# Altium footprint library Components.PcbLib: 41 footprints (part 3 of 3)
Each footprint in its own frame and in the unit in brackets; x right, y up, seen from the top. Pads: shape width x height; smd on the part's side, far side on the other; paste and mask are expansions set on the pad; w line width, h text height; cw(c..) or ccw(c..) is an arc to the next point about the centre after c.
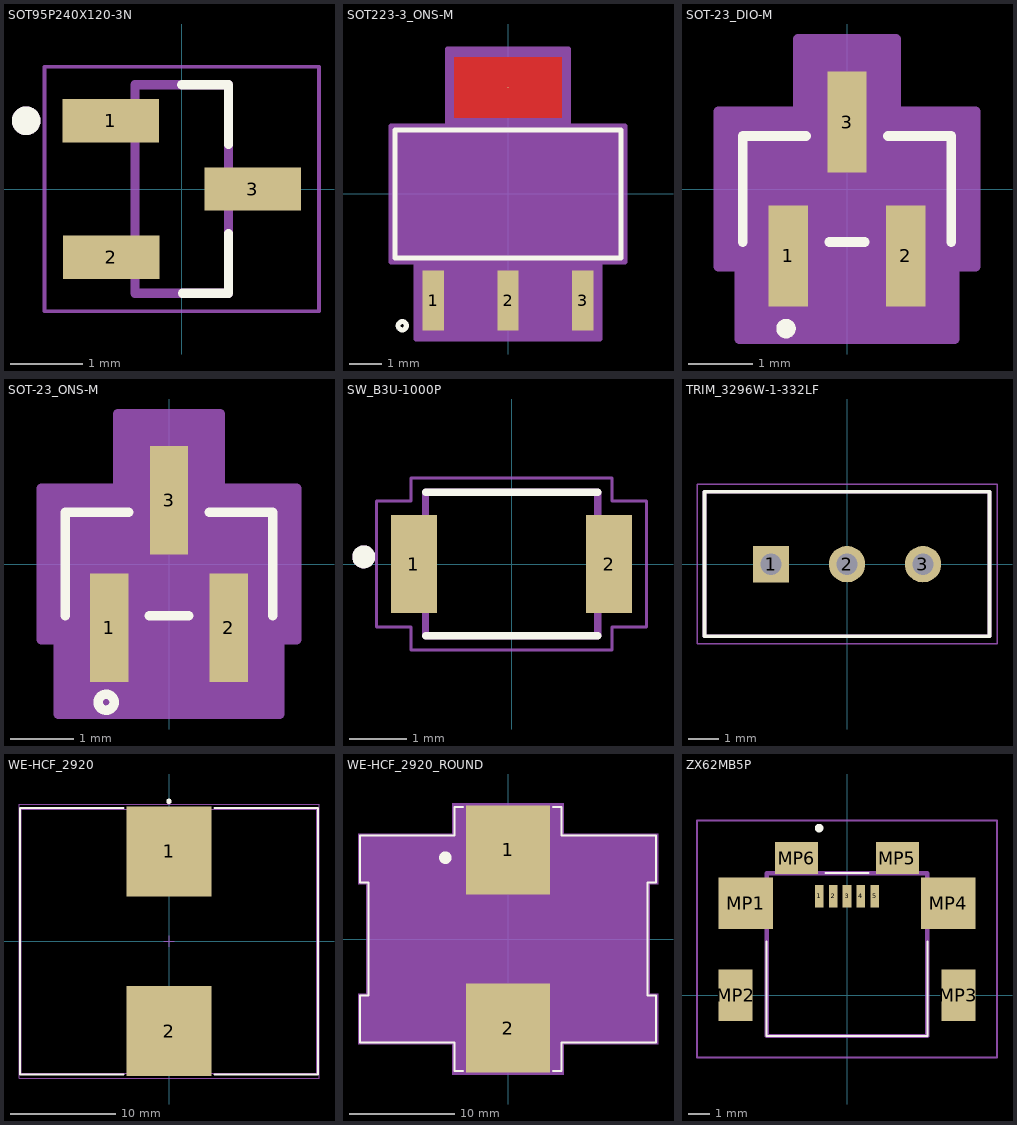
[diagram p2: the footprints below, top view; thin cyan lines are the x and y axes]

## SOT95P240X120-3N [mm]
height 1.2
pads (3):
  rect 1.34x0.6 smd paste+0 mask+0.102: 1(-0.99,0.95) 2(-0.98,-0.95) 3(0.99,0)
Top Overlay:
  circle w0.2: c-2.165,0.95 r0.1
  lines w0.127: 0,1.45 0.65,1.45 0.65,0.62 ; 0.01,-1.45 0.65,-1.45 0.65,-0.62
Mechanical 13:
  circle w0.2: c-2.165,0.95 r0.1
  lines w0.127: -0.65,-1.45 0.65,-1.45 0.65,1.45 -0.65,1.45 -0.65,-1.45
Mechanical 15:
  lines w0.05: -1.91,-1.7 1.91,-1.7 1.91,1.7 -1.91,1.7 -1.91,-1.7

## SOT223-3_ONS-M [mil]
pads (4):
  rect 26x73 smd paste+0 mask+0: 1(-90.5,-129) 2(0,-129) 3(90.5,-129)
  round 1 smd: 4(0,129)
Top Layer:
  region: 65,92.5 65,165.5 -65,165.5 -65,92.5
Top Overlay:
  circle w6: c-127.95,-159.45 r5
  lines w6: -136.5,-77.5 -136.5,77.5 136.5,77.5 136.5,-77.5 -136.5,-77.5
Top Paste:
  region: 65,92.5 65,165.5 -65,165.5 -65,92.5
Top Solder:
  region: 67,74.5 67,187.5 -67,187.5 -67,74.5
Mechanical 13:
  circle w0: c-121.5,-62.5 r5
  lines w1: -131.5,-72.5 -131.5,72.5 131.5,72.5 131.5,-72.5 -131.5,-72.5 ; -101.5,-143.5 -79.5,-143.5 -79.5,-72.5 -101.5,-72.5 -101.5,-143.5 ; -63,72.5 -63,143.5 63,143.5 63,72.5 -63,72.5 ; -11,-143.5 11,-143.5 11,-72.5 -11,-72.5 -11,-143.5 ; 79.5,-143.5 101.5,-143.5 101.5,-72.5 79.5,-72.5 79.5,-143.5
Mechanical 15:
  region: -141.5,-82.5 -141.5,82.5 -73,82.5 -73,175.5 73,175.5 73,82.5 141.5,82.5 141.5,-82.5 111.5,-82.5 111.5,-175.5 -111.5,-175.5 -111.5,-82.5
  lines w6: -141.5,-82.5 -111.5,-82.5 -111.5,-175.5 111.5,-175.5 111.5,-82.5 141.5,-82.5 141.5,82.5 73,82.5 73,175.5 -73,175.5 -73,82.5 -141.5,82.5 -141.5,-82.5
3D body "SOT223-3_ONS.step": height 68.11, standoff 0, extent -131.5,-143.5 131.5,143.5

## SOT-23_DIO-M [mil]
pads (3):
  rect 24x62 smd paste+0 mask+0: 1(-36.02,-41) 2(36.02,-41) 3(0,41)
Top Overlay:
  circle w6: c-37.4,-85.63 r3
  lines w6: -64,-32.5 -64,32.5 -25.1,32.5 ; -10.92,-32.5 10.92,-32.5 ; 25.1,32.5 64,32.5 64,-32.5
Mechanical 13:
  circle w0: c-36.02,-17.5 r3
  lines w1: -59,-27.5 -59,27.5 59,27.5 59,-27.5 -59,-27.5 ; -46.02,-50 -26.02,-50 -26.02,-27.5 -46.02,-27.5 -46.02,-50 ; -10,27.5 -10,50 10,50 10,27.5 -10,27.5 ; 26.02,-50 46.02,-50 46.02,-27.5 26.02,-27.5 26.02,-50
Mechanical 15:
  region: -79,-47.5 -79,47.5 -30,47.5 -30,92 30,92 30,47.5 79,47.5 79,-47.5 66.02,-47.5 66.02,-92 -66.02,-92 -66.02,-47.5
  lines w6: -79,-47.5 -66.02,-47.5 -66.02,-92 66.02,-92 66.02,-47.5 79,-47.5 79,47.5 30,47.5 30,92 -30,92 -30,47.5 -79,47.5 -79,-47.5
3D body "SOT-23_DIO.step": height 45.12, standoff 0, extent -59.02,-50 59.02,50

## SOT-23_ONS-M [mil]
pads (3):
  rect 24x68 smd paste+0 mask+0: 1(-37.5,-40) 2(37.5,-40) 3(0,40)
Top Overlay:
  circle w6: c-39.37,-86.61 r5
  lines w6: -65,-32.5 -65,32.5 -25.1,32.5 ; -12.4,-32.5 12.4,-32.5 ; 25.1,32.5 65,32.5 65,-32.5
Mechanical 13:
  circle w0: c-50,-17.5 r5
  lines w1: -60,-27.5 60,-27.5 60,27.5 -60,27.5 -60,-27.5 ; -47.5,-52 -47.5,-27.5 -27.5,-27.5 -27.5,-52 -47.5,-52 ; -10,27.5 10,27.5 10,52 -10,52 -10,27.5 ; 27.5,-52 27.5,-27.5 47.5,-27.5 47.5,-52 27.5,-52
Mechanical 15:
  region: -80,-47.5 -80,47.5 -32,47.5 -32,94 32,94 32,47.5 80,47.5 80,-47.5 69.5,-47.5 69.5,-94 -69.5,-94 -69.5,-47.5
  region: 60,-27.5 -60,-27.5 -60,27.5 60,27.5
  lines w6: -80,-47.5 -80,47.5 -32,47.5 -32,94 32,94 32,47.5 80,47.5 80,-47.5 69.5,-47.5 69.5,-94 -69.5,-94 -69.5,-47.5 -80,-47.5
3D body "SOT-23_ONS.step": height 44.09, standoff 0, extent -60,-52.01 60,52.01

## SW_B3U-1000P [mm]
pads (2):
  rect 0.8x1.7 smd: 1(-1.7,0) 2(1.7,0)
Top Overlay:
  circle w0.2: c-2.575,0.125 r0.1
  lines w0.127: -1.5,-1.25 1.5,-1.25 ; -1.5,1.25 1.5,1.25
Mechanical 13:
  circle w0.2: c-2.575,0.125 r0.1
  lines w0.127: -1.5,-1.25 1.5,-1.25 1.5,1.25 -1.5,1.25 -1.5,-1.25
Mechanical 15:
  lines w0.05: -2.35,-1.1 -2.35,1.1 -1.75,1.1 -1.75,1.5 1.75,1.5 1.75,1.1 2.35,1.1 2.35,-1.1 1.75,-1.1 1.75,-1.5 -1.75,-1.5 -1.75,-1.1 -2.35,-1.1
3D body "B3U-1000P.STEP": height 1.75, standoff 0, extent -2.025,-1.25 1.975,1.25

## TRIM_3296W-1-332LF [mm]
pads (3):
  rect 1.218x1.218 / inner round 1.218 / far side rect 1.218x1.218 hole 0.71: 1(-2.54,0)
  round 1.218 hole 0.71: 2(0,0) 3(2.54,0)
Top Overlay:
  lines w0.127: -4.765,-2.41 -4.765,2.42 4.765,2.42 4.765,-2.41 -4.765,-2.41
Mechanical 13:
  lines w0.127: -4.765,-2.41 4.765,-2.41 4.765,2.42 -4.765,2.42 -4.765,-2.41
Mechanical 15:
  lines w0.05: -5.015,-2.66 5.015,-2.66 5.015,2.67 -5.015,2.67 -5.015,-2.66
3D body "step_temp.STEP": height 11.55, standoff -7.72, extent -4.765,-2.41 4.765,2.42

## WE-HCF_2920 [mm] "SMD High Current Inductor, body 28x25mm"
height 20.5
pads (2):
  rect 8x8.5 smd: 1(0,8.5) 2(0,-8.5)
Top Overlay:
  circle w0.25: c0,13.25 r0.125
  lines w0.2: -4.3,-12.6 -14.1,-12.6 -14.1,12.6 -4.3,12.6 ; 4.3,-12.6 14.1,-12.6 14.1,12.6 4.3,12.6
Top 3D Body:
  lines w0.1: -14,-12.5 14,-12.5 14,12.5 -14,12.5 -14,-12.5
Top Courtyard:
  lines w0.1: -14.2,-12.95 14.2,-12.95 14.2,12.95 -14.2,12.95 -14.2,-12.95
Top Assembly:
  circle w0.1: c0,10.5 r1
  lines w0.1: -14,-12.5 -14,12.5 14,12.5 14,-12.5 -14,-12.5
Top Designator:
  text ".Designator" at -3.647,-0.357 h1
Top Component Center:
  lines w0.1: -0.5,0 0.5,0 ; 0,-0.5 0,0.5
3D body "74437429203xxx.stp": height 20, standoff 0, extent -13.65,-11.548 13.65,11.548

## WE-HCF_2920_ROUND [mm]
pads (2):
  rect 8x8.5 smd paste+0 mask+0.102: 1(0,8.5) 2(0,-8.5)
Top Overlay:
  circle w0.6: c-5.975,7.75 r0.3
  lines w0.2: -4.3,-12.6 -5.1,-12.6 -5.1,-9.85 -14.1,-9.85 -14.1,-5.4 -13.3,-5.4 -13.3,5.4 -14.1,5.4 -14.1,9.85 -5.1,9.85 -5.1,12.6 -4.3,12.6 ; 4.3,-12.6 5.1,-12.6 5.1,-9.85 14.1,-9.85 14.1,-5.4 13.3,-5.4 13.3,5.4 14.1,5.4 14.1,9.85 5.1,9.85 5.1,12.6 4.3,12.6
Mechanical 13:
  lines w0.1: -14,-9.75 -14,-5.5 -13.2,-5.5 -13.2,5.5 -14,5.5 -14,9.75 -5,9.75 -5,12.5 5,12.5 5,9.75 14,9.75 14,5.5 13.2,5.5 13.2,-5.5 14,-5.5 14,-9.75 5,-9.75 5,-12.5 -5,-12.5 -5,-9.75 -14,-9.75
Mechanical 15:
  region: 5.3,10.05 14.3,10.05 14.3,5.2 13.5,5.2 13.5,-5.2 14.3,-5.2 14.3,-10.05 5.3,-10.05 5.3,-12.95 -5.3,-12.95 -5.3,-10.05 -14.3,-10.05 -14.3,-5.2 -13.5,-5.2 -13.5,5.2 -14.3,5.2 -14.3,10.05 -5.3,10.05 -5.3,12.95 5.3,12.95
3D body "Download_STP_WE-HCF-2920-Round+%28rev1%29.stp": height 20, standoff 0, extent -13.625,-11.448 13.675,11.648

## ZX62MB5P [mm]
pads (11):
  rect 0.4x1.05 smd: 1(-1.3,4.625) 2(-0.65,4.625) 3(0,4.625) 4(0.65,4.625) 5(1.3,4.625)
  rect 2.55x2.4 smd: MP1(-4.725,4.3) MP4(4.725,4.3)
  rect 1.6x2.4 smd: MP2(-5.2,0) MP3(5.2,0)
  rect 2x1.5 smd: MP5(2.35,6.4) MP6(-2.35,6.4)
Top Overlay:
  lines w0.1: -3.75,2.5 -3.75,-1.9 3.75,-1.9 3.75,2.5 ; -1,5.7 1,5.7
  lines w0.2: -1.3,7.7 cw(c-1.3,7.8) -1.3,7.9 cw(c-1.3,7.8) -1.3,7.7
Mechanical 15:
  lines w0.2: -3.75,-1.9 -3.75,5.7 3.75,5.7 3.75,-1.9 -3.75,-1.9
Bottom Assembly:
  lines w0.1: -7,-2.9 -7,8.15 7,8.15 7,-2.9 -7,-2.9
3D body "ZX62M-B-5P.stp": height 1.64, standoff -1.44, extent -5.725,-2.875 5.775,6.42